# Altium footprint library Capacitors.PcbLib: 90 footprints (part 2 of 6)
Each footprint in its own frame and in the unit in brackets; x right, y up, seen from the top. Pads: shape width x height; smd on the part's side, far side on the other; paste and mask are expansions set on the pad; w line width, h text height; cw(c..) or ccw(c..) is an arc to the next point about the centre after c.
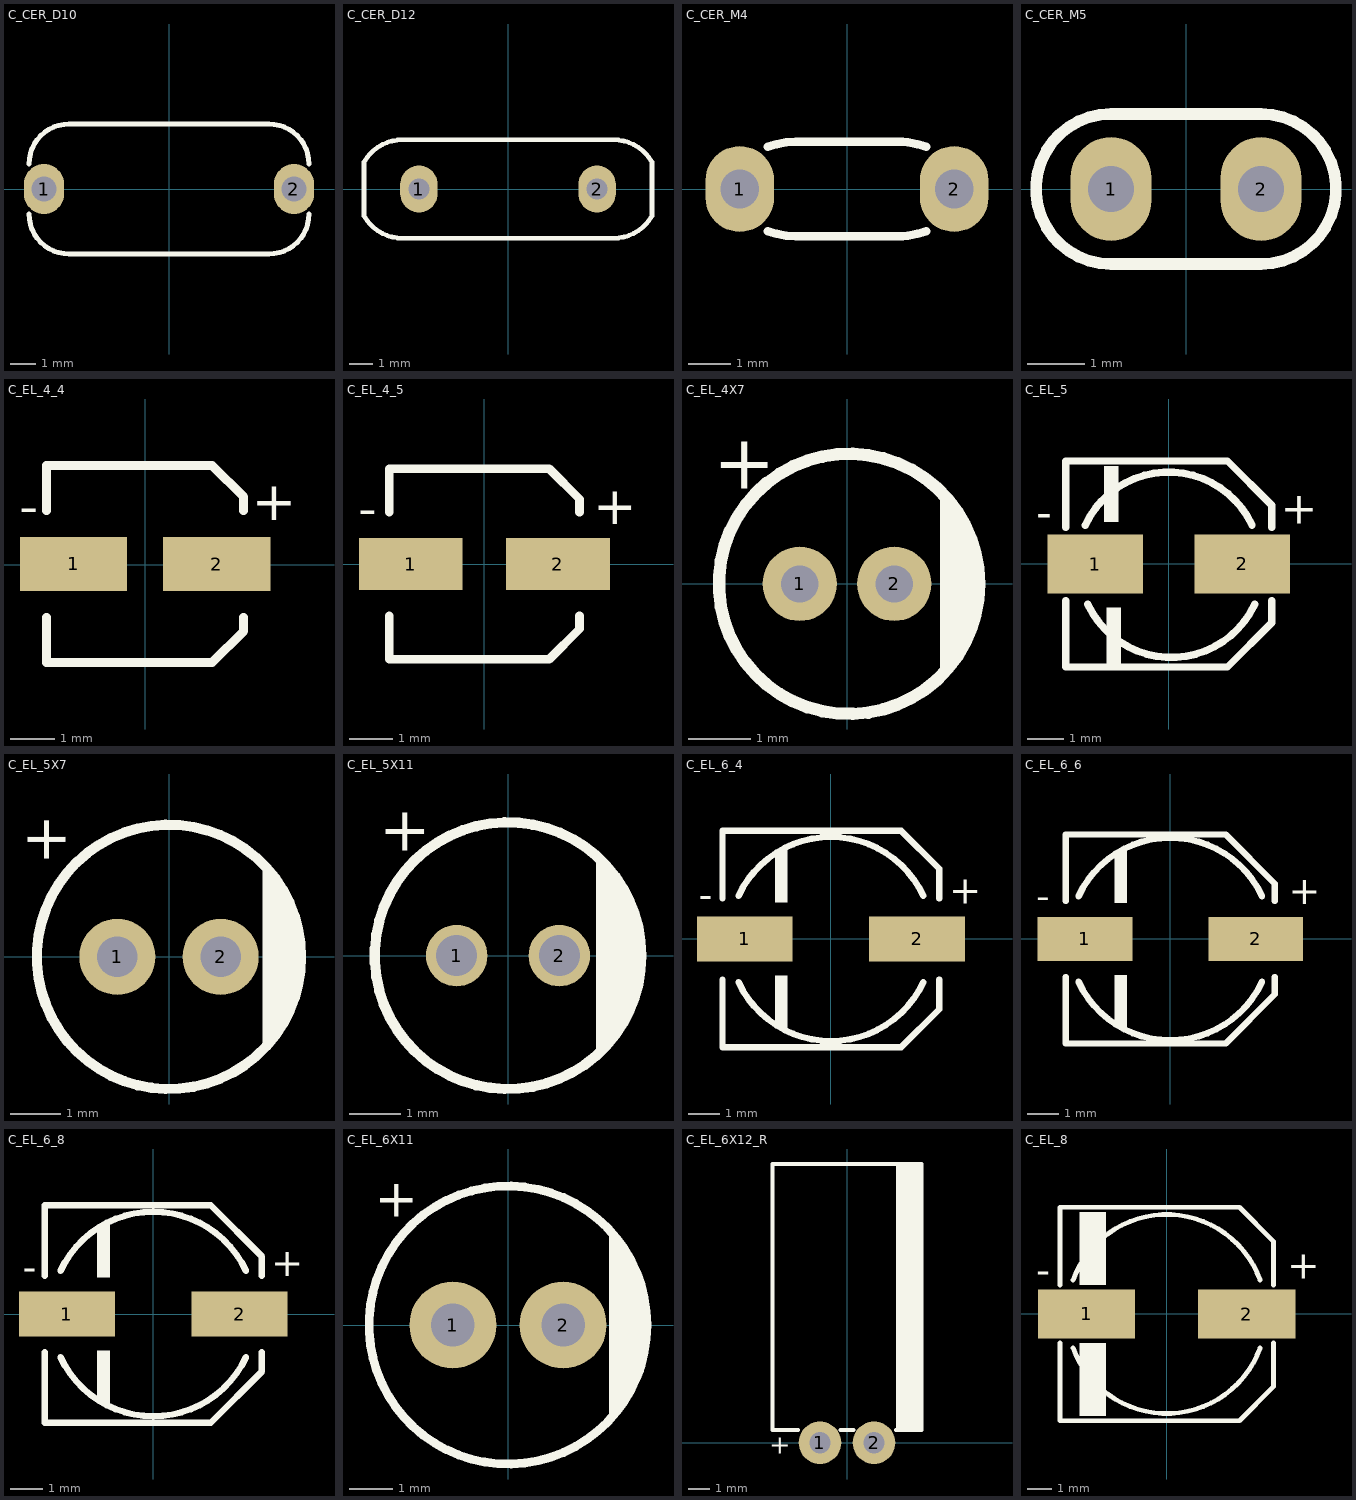
[diagram p1: the footprints below, top view; thin cyan lines are the x and y axes]

## C_CER_D10 [mm] "CAP, CER MULTILAYER, 12X4mm, pitch: 7.5mm"
height 5.5
pads (2):
  oval 1.6x2 hole 1: 1(-5,0) 2(5,0)
Top Overlay:
  lines w0.2: -5.6,-1 ccw(c-4,-1) -4,-2.6 4,-2.6 ccw(c4,-1) 5.6,-1 ; -5.6,1 cw(c-4,1) -4,2.6 4,2.6 cw(c4,1) 5.6,1
3D body "User Library-capacitor 10mm pitch.step": height 12.5, standoff -4, extent -5.5,-2.5 5.5,2.5

## C_CER_D12 [mm] "CAP, CER MULTILAYER, 12X4mm, pitch: 7.5mm"
height 5.5
pads (2):
  oval 1.6x2 hole 0.9: 1(-3.8,0) 2(3.8,0)
Top Overlay:
  lines w0.2: -6.145,-1.15 ccw(c-4.5,-0.2) -4.5,-2.1 4.5,-2.1 ccw(c4.5,-0.2) 6.145,-1.15 6.145,1.15 ccw(c4.5,0.2) 4.5,2.1 -4.5,2.1 ccw(c-4.5,0.2) -6.145,1.15 -6.145,-1.15
3D body: height 8, standoff -2, extent 3.503,-0.299 4.1,0.3
3D body: height 8, standoff -2, extent -4.097,-0.299 -3.5,0.3
3D body: height 16, standoff 4, extent -6,-2 6,2

## C_CER_M4 [mm] "CAP, CER MULTILAYER, 4.2X2.0mm, pitch: 5.0mm, TDK FK24"
height 5.5
pads (2):
  oval 1.6x2 hole 0.9: 1(-2.5,0) 2(2.5,0)
Top Overlay:
  lines w0.2: -1.85,-0.985 ccw(c-1.2,0.8) -1.2,-1.1 1.3,-1.1 ; -1.85,0.985 cw(c-1.2,-0.8) -1.2,1.1 1.3,1.1 ; 1.2,-1.1 ccw(c1.2,0.8) 1.85,-0.985 ; 1.2,1.1 cw(c1.2,-0.8) 1.85,0.985
3D body "TDK FK24 ceramic capacitor.STEP": height 5.49, standoff -2.54, extent -2.8,-1.003 2.8,1.003

## C_CER_M5 [mm] "CAP, CER MULTILAYER, 5.0X2.5mm, pitch: 2.5mm, RAD0.1"
height 6.5
pads (2):
  oval 1.4x1.8 hole 0.8: 1(-1.3,0) 2(1.3,0)
Top Overlay:
  lines w0.2: -1.3,-1.3 cw(c-1.3,0) -1.3,1.3 1.3,1.3 cw(c1.3,0) 1.3,-1.3 -1.3,-1.3
3D body "Capacitor ceramico 0_2in pitch.step": height 5.5, standoff -3.33, extent -2.75,-1.25 2.75,1.25

## C_EL_4_4 [mm] "Electrolytic Cap, D: 4.3mm, Size B, 3.9mm Height"
height 3.9
pads (2):
  rect 2.4x1.2 smd: 1(-1.6,0.013) 2(1.6,0.013)
Top Overlay:
  lines w0.2: -2.2,-1.187 -2.2,-2.187 1.5,-2.187 2.2,-1.487 2.2,-1.187 ; -2.2,1.213 -2.2,2.213 1.5,2.213 2.2,1.513 2.2,1.213
  text "-" at -2.819,0.613 h1.5
  text "+" at 2.388,0.696 h1.5
3D body "User Library-CAPSMD4x3_9.STEP": height 3.91, standoff 0, extent -2.343,-2.137 2.257,2.163

## C_EL_4_5 [mm] "Electrolytic Cap, D: 4.3mm, Size B, 5.5mm Height"
height 5.5
pads (2):
  rect 2.4x1.2 smd: 1(-1.7,0) 2(1.7,0)
Top Overlay:
  lines w0.2: -2.2,-1.2 -2.2,-2.2 1.5,-2.2 2.2,-1.5 2.2,-1.2 ; -2.2,1.2 -2.2,2.2 1.5,2.2 2.2,1.5 2.2,1.2
  text "-" at -2.919,0.601 h1.5
  text "+" at 2.515,0.632 h1.5
3D body "4x5.5x1.stp": height 5.5, standoff 0, extent -2.5,-2.15 2.5,2.15

## C_EL_4X7 [mm] "Cap Elec, D4.0X7.0H pitch: 1.5mm"
height 7
pads (2):
  round 1.2 hole 0.6: 1(-0.762,0) 2(0.762,0)
Top Overlay:
  circle w0.2: c0.032,0 r2.1
  rectangle: 1.499,-1.021 1.965,1.039
  rectangle: 1.778,-0.548 2.159,0.544
  rectangle: 1.499,-1.346 1.778,-0.787
  rectangle: 1.499,0.765 1.778,1.346
  text "+" at -2.159,1.242 h1.5
3D body "User Library-Cap electrolitic radial 4x7.STEP": height 1, standoff -7.5, extent -1.993,-1.994 1.999,1.992

## C_EL_5 [mm] "Electrolytic Cap, D: 5.0mm, L: 5.8mm, Size C3"
pads (2):
  rect 2.6x1.6 smd: 1(-2,0) 2(2,0)
Top Overlay:
  region: -1.36,2.667 -1.76,2.667 -1.76,1.143 -1.36,1.143
  region: -1.29,-1.185 -1.69,-1.185 -1.69,-2.709 -1.29,-2.709
  lines w0.2: -2.8,-2.8 1.6,-2.8 2.8,-1.6 2.8,-1 ; -2.8,-2.785 -2.8,-1 ; -2.8,1 -2.8,2.785 ; -2.266,1.057 cw(c0,0) 2.266,1.057 ; -2.196,-1.098 ccw(c0.07,-0.042) 2.335,-1.098 ; 2.8,1 2.8,1.6 1.6,2.8 -2.8,2.8 -2.8,2.785 ; -2.8,2.785 -2.8,2.785
  text "+" at 3.048,0.81 h1.5
  text "-" at -3.607,0.702 h1.5
3D body "5x5.8x1.4.stp": height -0.4, standoff -6.2, extent -3.102,-2.726 2.898,2.574

## C_EL_5X7 [mm] "Cap Elec, D5.0X7.0H pitch: 2mm"
pads (2):
  round 1.5 hole 0.8: 1(-1.016,0) 2(1.016,0)
Top Overlay:
  circle w0.2: c0,0 r2.6
  rectangle: 1.844,-1.706 2.048,1.73
  rectangle: 2.184,-0.825 2.551,0.864
  rectangle: 2.137,-1.245 2.365,1.27
  rectangle: 1.947,-1.567 2.201,1.564
  text "+" at -1.75,1.803 h1.5
3D body "User Library-Cap electro 5x7x2mm.step": height 7.33, standoff -3.47, extent -2.525,-2.525 2.525,2.526

## C_EL_5X11 [mm] "Cap Elec, D5.0X11.0H pitch: 2mm"
height 11
pads (2):
  round 1.2 hole 0.8: 1(-1,0) 2(1,0)
Top Overlay:
  circle w0.2: c0,0 r2.6
  rectangle: 2.126,-1.208 2.355,1.269
  rectangle: 1.829,-1.475 2.234,1.34
  rectangle: 2.057,-1.397 2.159,1.422
  rectangle: 1.72,-1.892 1.923,-1.675
  rectangle: 1.717,1.623 1.879,1.871
  rectangle: 1.718,-1.702 2.083,1.695
  rectangle: 2.286,-0.94 2.527,0.947
  text "+" at -2.515,1.75 h1.5
3D body "User Library-Cap electro 5x11x2mm.step": height 2.67, standoff -12.13, extent -2.525,-2.525 2.525,2.525

## C_EL_6_4 [mm] "Electrolytic Cap, D: 6.3mm L: 3.9mm, Size D"
height 4
pads (2):
  rect 3x1.4 smd: 1(-2.7,0) 2(2.7,0)
Top Overlay:
  region: -1.36,-1.143 -1.76,-1.143 -1.76,-2.8 -1.36,-2.8
  region: -1.36,2.8 -1.76,2.8 -1.76,1.143 -1.36,1.143
  lines w0.2: -3.4,-1.27 -3.4,-3.4 2.2,-3.4 3.4,-2.2 3.4,-1.27 ; -3.4,1.27 -3.4,3.4 2.2,3.4 3.4,2.2 3.4,1.27 ; -2.9,-1.352 ccw(c0,0) 2.9,-1.352 ; -2.9,1.352 cw(c0,0) 2.9,1.352
  text "-" at -4.14,0.677 h1.5
  text "+" at 3.708,0.81 h1.5
3D body "User Library-CAPSMD6_3x3_9.STEP": height 3.91, standoff 0, extent -3.414,-3.3 3.586,3.3

## C_EL_6_6 [mm] "Electrolytic Cap, D: 6.3mm L: 5.8mm, Size D"
height 5.8
pads (2):
  rect 3x1.4 smd: 1(-2.7,0) 2(2.7,0)
Top Overlay:
  region: -1.36,2.8 -1.76,2.8 -1.76,1.143 -1.36,1.143
  region: -1.36,-1.143 -1.76,-1.143 -1.76,-2.8 -1.36,-2.8
  lines w0.2: -3.3,-1.2 -3.3,-3.3 1.75,-3.3 3.3,-1.75 3.3,-1.2 ; -3.3,1.2 -3.3,3.3 1.75,3.3 3.3,1.75 3.3,1.2 ; -2.9,-1.352 ccw(c0,0) 2.9,-1.352 ; -2.9,1.352 cw(c0,0) 2.9,1.352
  text "+" at 3.736,0.796 h1.5
  text "-" at -4.242,0.663 h1.5
3D body "6.3x5.8x2.2.stp": height 5.8, standoff 0, extent -3.65,-3.3 3.65,3.3

## C_EL_6_8 [mm] "Electrolytic Cap, D: 6.3mm L: 7.7mm, Size D"
height 7.7
pads (2):
  rect 3x1.4 smd: 1(-2.7,0) 2(2.7,0)
Top Overlay:
  region: -1.36,-1.143 -1.76,-1.143 -1.76,-2.8 -1.36,-2.8
  region: -1.36,2.8 -1.76,2.8 -1.76,1.143 -1.36,1.143
  lines w0.2: -3.4,-1.2 -3.4,-3.4 1.8,-3.4 3.4,-1.8 3.4,-1.2 ; -3.4,1.2 -3.4,3.4 1.8,3.4 3.4,1.8 3.4,1.2 ; -2.9,-1.352 ccw(c0,0) 2.9,-1.352 ; -2.9,1.352 cw(c0,0) 2.9,1.352
  text "+" at 3.685,0.886 h1.5
  text "-" at -4.089,0.753 h1.5
3D body "6.3x7.7x2.2.stp": height 7.7, standoff 0, extent -3.65,-3.3 3.65,3.3

## C_EL_6X11 [mm] "Cap Elec, D6.3X11.0H pitch: 2.5mm"
height 11
pads (2):
  round 2 hole 1: 1(-1.27,0) 2(1.27,0)
Top Overlay:
  circle w0.2: c0,0 r3.2
  rectangle: 2.89,-1.091 3.131,0.991
  rectangle: 2.322,-1.853 2.687,1.904
  rectangle: 2.321,1.471 2.483,2.057
  rectangle: 2.324,-2.108 2.527,-1.826
  rectangle: 2.661,-1.549 2.763,1.626
  rectangle: 2.433,-1.627 2.838,1.471
  rectangle: 2.73,-1.36 2.959,1.27
  text "+" at -3.073,2.207 h1.5
3D body "SW3dPS-Cap electro 6.3x11x2.5mm.STEP": height 2.51, standoff -12.03, extent -3.175,-3.175 3.175,3.176

## C_EL_6X12_R [mm] "Cap Elec, D6.3X12.0H pitch: 2.5mm"
height 11
pads (2):
  round 2 hole 1: 1(-1.27,0) 2(1.27,0)
Top Overlay:
  rectangle: 2.3,0.6 3.5,13.1
  lines w0.2: -2.3,0.6 -3.5,0.6 -3.5,13.1 3.5,13.1 3.5,0.6 2.3,0.6 ; -0.3,0.6 0.3,0.6
  text "+" at -2.647,0.542 h1.5
3D body "CAPAE250P680X1220_FLAT1.STEP": height 6.8, standoff -1.78, extent -3.39,-0.248 3.39,12.952

## C_EL_8 [mm] "Electrolytic Cap, Size E, Size F, 8.3X10"
height 10
pads (2):
  rect 4x2 smd: 1(-3.3,0) 2(3.3,0)
Top Overlay:
  region: -2.5,-1.2 -3.6,-1.2 -3.6,-4.2 -2.5,-4.2
  region: -2.5,4.2 -3.6,4.2 -3.6,1.2 -2.5,1.2
  lines w0.2: -4.4,-1.2 -4.4,-4.4 3,-4.4 4.4,-3 4.4,-1.2 ; -4.4,1.2 -4.4,4.4 3,4.4 4.4,3 4.4,1.2 ; -3.853,-1.402 ccw(c0,0) 3.853,-1.402 ; -3.853,1.402 cw(c0,0) 3.853,1.402
  text "-" at -5.385,0.886 h2
  text "+" at 4.978,1.063 h2
3D body "Cap_0810.STEP": height 10.3, standoff -0.2, extent -4.798,-4.25 4.902,4.25